# Altium footprint library PcbLib1.PcbLib: 31 footprints (part 1 of 2)
Each footprint in its own frame and in the unit in brackets; x right, y up, seen from the top. Pads: shape width x height; smd on the part's side, far side on the other; paste and mask are expansions set on the pad; w line width, h text height; cw(c..) or ccw(c..) is an arc to the next point about the centre after c.
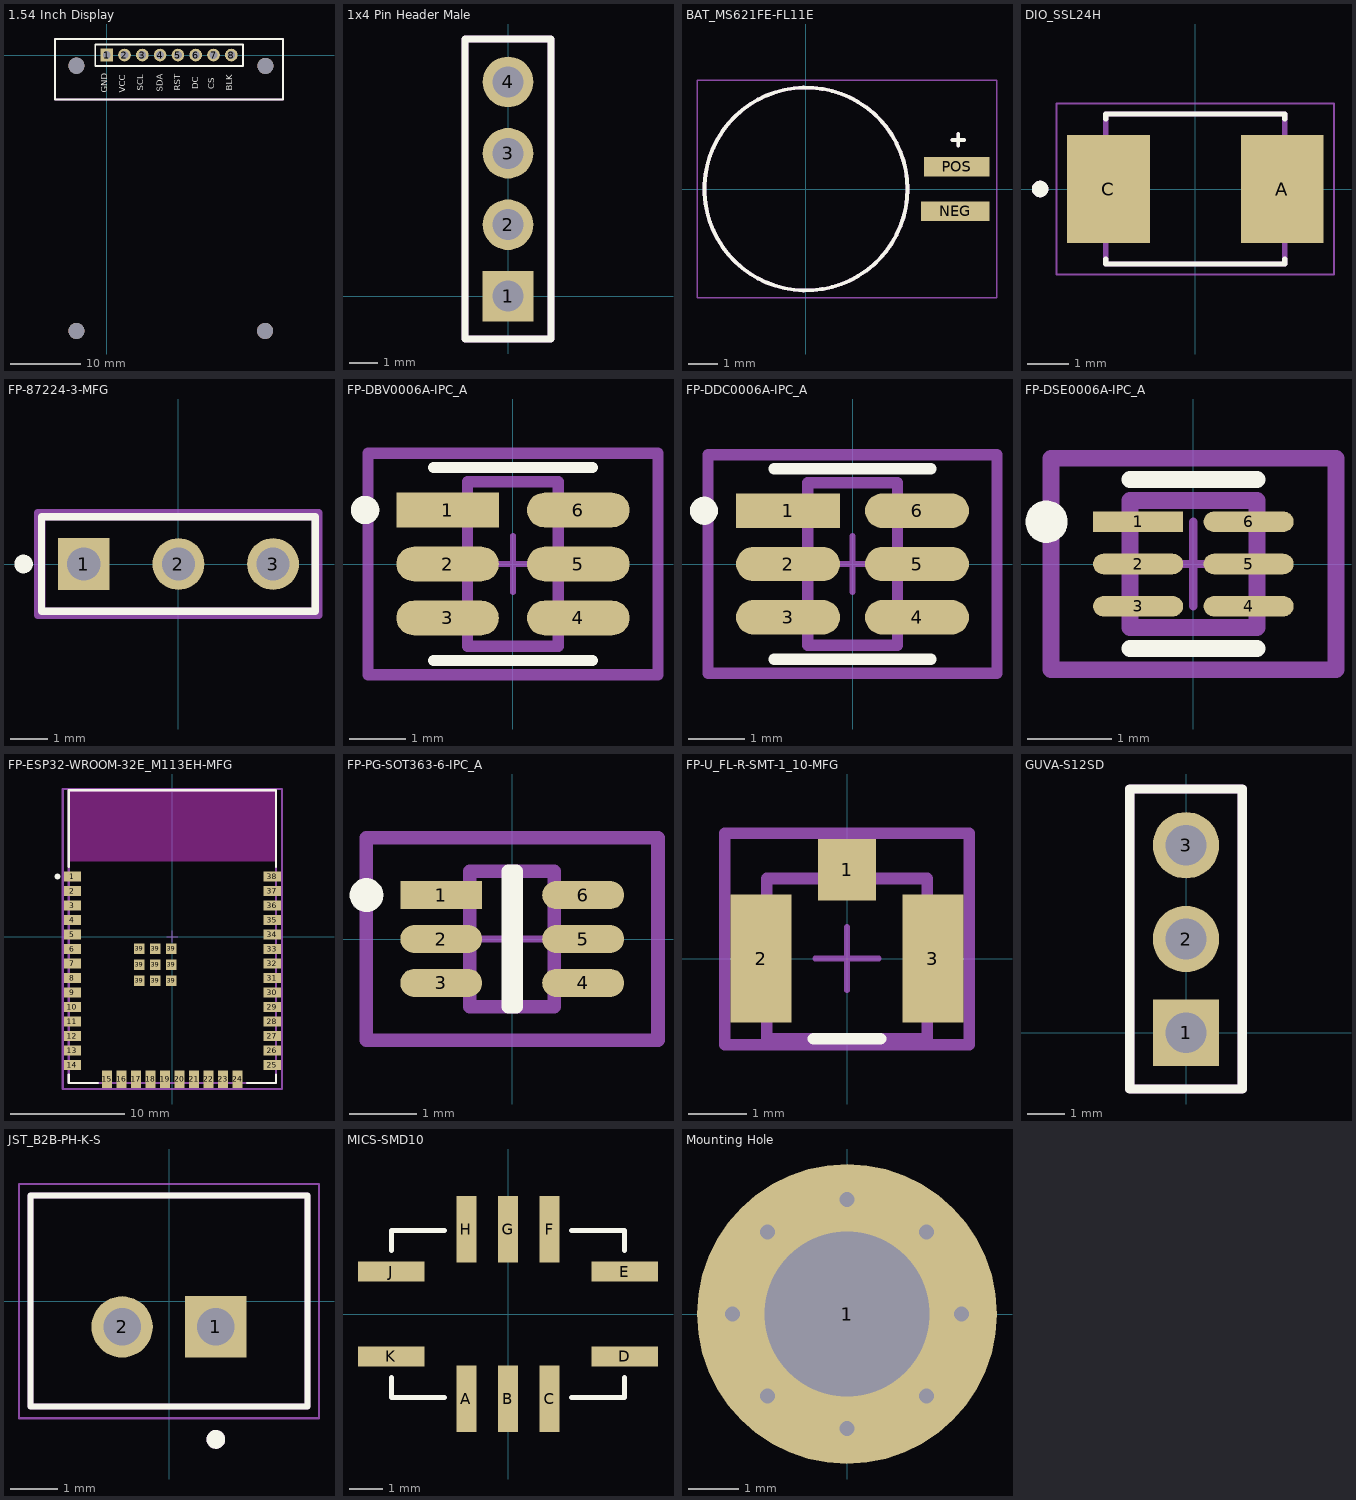
[diagram p0: the footprints below, top view; thin cyan lines are the x and y axes]

## 1.54 Inch Display [mm]
pads (12):
  rect 1.8x1.8 hole 1.1: 1(0,0)
  round 1.8 hole 1.1: 2(2.54,0) 3(5.08,0) 4(7.62,0) 5(10.16,0) 6(12.7,0) 7(15.24,0) 8(17.78,0)
  round 2.3 hole 2.3 unplated: ""(-4.318,-39.37) ""(-4.318,-1.524) ""(22.606,-39.37) ""(22.638,-1.547)
Top Overlay:
  lines w0.254: -7.366,-6.35 -7.366,2.286 25.146,2.286 25.146,-6.35 -7.366,-6.35 ; -1.626,-1.549 -1.626,1.499 19.456,1.499 19.456,-1.549 -1.626,-1.549
  text "BLK" at 18.186,-5.105 h1.5
  text "CS" at 15.628,-4.851 h1.5
  text "DC" at 13.344,-4.851 h1.5
  text "RST" at 10.802,-5.105 h1.5
  text "SDA" at 8.262,-5.232 h1.5
  text "SCL" at 5.468,-5.105 h1.5
  text "VCC" at 2.93,-5.359 h1.5
  text "GND" at 0.388,-5.359 h1.5
Mechanical 13:
  lines w0.254: -7.366,-6.35 -7.366,2.286 25.146,2.286 25.146,-6.35 -7.366,-6.35
3D body "1x8.STEP": height 22.8, standoff 11.46, extent -1.27,-1.3 19.05,1.24
3D body "ER-TFTM1.54-1_3D.stp": height 22.69, standoff 18.8, extent -7.216,-42.257 25.016,1.457
3D body "Standoff mf - M2.5 x 20 across flats 5mm.step": height 20, standoff -6, extent -6.818,-42.257 -1.818,-36.483
3D body "Standoff mf - M2.5 x 20 across flats 5mm.step": height 20, standoff -6, extent 20.138,-4.434 25.138,1.34
3D body "Standoff mf - M2.5 x 20 across flats 5mm.step": height 20, standoff -6, extent -6.818,-4.411 -1.818,1.363
3D body "Standoff mf - M2.5 x 20 across flats 5mm.step": height 20, standoff -6, extent 20.138,-42.257 25.138,-36.483

## 1x4 Pin Header Male [mm]
pads (4):
  rect 1.8x1.8 hole 1.1: 1(0,0)
  round 1.8 hole 1.1: 2(0,2.54) 3(0,5.08) 4(0,7.62)
Top Overlay:
  lines w0.254: -1.524,-1.524 1.524,-1.524 1.524,9.144 -1.524,9.144 -1.524,-1.524
Mechanical 13:
  lines w0.254: -1.524,-1.524 -1.524,9.144 1.524,9.144 1.524,-1.524 -1.524,-1.524

## 1000 mAh battery [mm]
3D body "1100mAh lipo v8.step": height 10, standoff 2, extent -23.2,-14 23,14

## BAT_MS621FE-FL11E [mm]
pads (2):
  rect 2.3x0.65 smd: NEG(5,-0.75)
  rect 2.2x0.65 smd: POS(5.05,0.75)
Top Overlay:
  circle w0.127: c0,0 r3.4
  lines w0.127: 4.9,1.646 5.3,1.646 ; 5.1,1.446 5.1,1.846
Mechanical 13:
  circle w0.127: c0,0 r3.4
  lines w0.127: 4.9,1.646 5.3,1.646 ; 5.1,1.446 5.1,1.846
Mechanical 15:
  lines w0.05: -3.65,-3.65 6.4,-3.65 6.4,3.65 -3.65,3.65 -3.65,-3.65
3D body "step_temp.STEP": height 2.8, standoff 0, extent -3.391,-3.4 5.9,3.4

## DIO_SSL24H [mm]
pads (2):
  rect 2x2.6 smd: A(2.1,0) C(-2.1,0)
Top Overlay:
  circle w0.2: c-3.75,0 r0.1
  lines w0.127: -2.163,-1.7 -2.163,-1.813 2.163,-1.813 2.163,-1.7 ; -2.163,1.7 -2.163,1.813 2.163,1.813 2.163,1.7
Mechanical 13:
  circle w0.2: c-3.75,0 r0.1
  lines w0.127: -2.163,-1.813 2.163,-1.813 2.163,1.813 -2.163,1.813 -2.163,-1.813
Mechanical 15:
  lines w0.05: -3.35,-2.063 3.35,-2.063 3.35,2.063 -3.35,2.063 -3.35,-2.063
3D body "step_temp.STEP": height 2.65, standoff 0, extent -2.675,-1.813 2.675,1.813

## FP-87224-3-MFG [mil]
pads (3):
  rect 54.69x54.69 hole 35 paste-99999 mask+0: 1(-100,0)
  round 54.69 hole 35 paste-99999 mask+0: 2(0,0) 3(100,0)
Top Overlay:
  circle w9.84: c-163.39,0 r4.92
  lines w7.87: -144.55,-50.05 144.55,-50.05 144.55,50.05 -144.55,50.05 -144.55,-50.05
Top 3D Body:
  lines w7.87: -144.5,-50 144.5,-50 144.5,50 -144.5,50 -144.5,-50
Top Courtyard:
  lines w7.87: -148.44,-53.94 148.44,-53.94 148.44,53.94 -148.44,53.94 -148.44,-53.94
Top Assembly:
  lines w7.87: -148.44,-53.94 148.44,-53.94 148.44,53.94 -148.44,53.94 -148.44,-53.94
  text ".Designator" at 0,-0.02 h39.37
Top Component Center:
  lines w3.94: -19.68,0 19.68,0 ; 0,-19.68 0,19.68
3D body "Conn_TE_Connectivity_87224-3_eec.STEP": height 10, standoff 0, extent -148.44,-53.94 148.44,53.94
3D body "Pin header jumper.stp": height 338.58, standoff 102.36, extent -49.43,-47 147.43,51.43

## FP-DBV0006A-IPC_A [mm]
pads (6):
  rect 1.805x0.61 smd paste+0 mask+0: 1(-1.15,0.95)
  rrect100% 1.805x0.61 smd paste+0 mask+0: 2(-1.15,0) 3(-1.15,-0.95) 4(1.15,-0.95) 5(1.15,0) 6(1.15,0.95)
Top Overlay:
  circle w0.25: c-2.603,0.95 r0.125
  lines w0.2: -1.4,-1.7 1.4,-1.7 ; -1.4,1.7 1.4,1.7
Top 3D Body:
  lines w0.2: -0.8,-1.45 0.8,-1.45 0.8,1.45 -0.8,1.45 -0.8,-1.45
Top Courtyard:
  lines w0.2: -2.553,-1.95 2.553,-1.95 2.553,1.95 -2.553,1.95 -2.553,-1.95
Top Assembly:
  lines w0.2: -2.553,-1.95 2.553,-1.95 2.553,1.95 -2.553,1.95 -2.553,-1.95
  text ".Designator" at 0,0.188 h1
Top Component Center:
  lines w0.1: -0.5,0 0.5,0 ; 0,-0.5 0,0.5
3D body "IC_Texas_Instruments_LM74700QDBVRQ1_eec.STEP": height 0.25, standoff 0, extent -2.553,-1.95 2.553,1.95

## FP-DDC0006A-IPC_A [mm]
pads (6):
  rect 1.854x0.612 smd paste+0 mask+0: 1(-1.15,0.95)
  rrect100% 1.854x0.612 smd paste+0 mask+0: 2(-1.15,0) 3(-1.15,-0.95) 4(1.15,-0.95) 5(1.15,0) 6(1.15,0.95)
Top Overlay:
  circle w0.25: c-2.65,0.95 r0.125
  lines w0.2: -1.4,-1.7 1.4,-1.7 ; -1.4,1.7 1.4,1.7
Top 3D Body:
  lines w0.2: -0.8,-1.45 0.8,-1.45 0.8,1.45 -0.8,1.45 -0.8,-1.45
Top Courtyard:
  lines w0.2: -2.577,-1.95 2.577,-1.95 2.577,1.95 -2.577,1.95 -2.577,-1.95
Top Assembly:
  lines w0.2: -2.577,-1.95 2.577,-1.95 2.577,1.95 -2.577,1.95 -2.577,-1.95
  text ".Designator" at 0,0.188 h1
Top Component Center:
  lines w0.1: -0.5,0 0.5,0 ; 0,-0.5 0,0.5
3D body "IC_Texas_Instruments_TPS562201DDCT_eec.STEP": height 0.25, standoff 0, extent -2.577,-1.95 2.577,1.95

## FP-DSE0006A-IPC_A [mm]
pads (6):
  rect 1.065x0.242 smd paste+0 mask+0: 1(-0.654,0.5)
  rrect100% 1.065x0.242 smd paste+0 mask+0: 2(-0.654,0) 3(-0.654,-0.5) 4(0.654,-0.5) 5(0.654,0) 6(0.654,0.5)
Top Overlay:
  circle w0.25: c-1.736,0.5 r0.125
  lines w0.2: -0.75,-1 0.75,-1 ; -0.75,1 0.75,1
Top 3D Body:
  lines w0.2: -0.75,-0.75 -0.75,0.75 0.75,0.75 0.75,-0.75 -0.75,-0.75
Top Courtyard:
  lines w0.2: -1.686,-1.25 -1.686,1.25 1.686,1.25 1.686,-1.25 -1.686,-1.25
Top Assembly:
  lines w0.2: -1.686,-1.25 -1.686,1.25 1.686,1.25 1.686,-1.25 -1.686,-1.25
  text ".Designator" at 0,0.188 h1
Top Component Center:
  lines w0.1: -0.5,0 0.5,0 ; 0,-0.5 0,0.5
3D body "IC_Texas_Instruments_BQ29700DSET_eec.STEP": height 0.25, standoff 0, extent -1.686,-1.25 1.686,1.25

## FP-ESP32-WROOM-32E_M113EH-MFG [mm]
pads (47):
  rect 1.5x0.9 smd paste+0 mask+0: 1(-8.75,5.26) 2(-8.75,3.99) 3(-8.75,2.72) 4(-8.75,1.45) 5(-8.75,0.18) 6(-8.75,-1.09) 7(-8.75,-2.36) 8(-8.75,-3.63) 9(-8.75,-4.9) 10(-8.75,-6.17) 11(-8.75,-7.44) 12(-8.75,-8.71) 13(-8.75,-9.98) 14(-8.75,-11.25) 25(8.75,-11.25) 26(8.75,-9.98) 27(8.75,-8.71) 28(8.75,-7.44) 29(8.75,-6.17) 30(8.75,-4.9) 31(8.75,-3.63) 32(8.75,-2.36) 33(8.75,-1.09) 34(8.75,0.18) 35(8.75,1.45) 36(8.75,2.72) 37(8.75,3.99) 38(8.75,5.26)
  rect 0.9x1.5 smd paste+0 mask+0: 15(-5.715,-12.5) 16(-4.445,-12.5) 17(-3.175,-12.5) 18(-1.905,-12.5) 19(-0.635,-12.5) 20(0.635,-12.5) 21(1.905,-12.5) 22(3.175,-12.5) 23(4.445,-12.5) 24(5.715,-12.5)
  rect 0.9x0.9 smd paste+0 mask+0: 39(-2.9,-3.86) 39(-2.9,-2.46) 39(-2.9,-1.06) 39(-1.5,-3.86) 39(-1.5,-2.46) 39(-1.5,-1.06) 39(-0.1,-3.86) 39(-0.1,-2.46) 39(-0.1,-1.06)
Top Overlay:
  circle w0.25: c-10.05,5.26 r0.125
  lines w0.2: -9.075,-12.075 -9.075,-12.825 -6.54,-12.825 ; -9.075,6.085 -9.075,12.825 9.075,12.825 9.075,6.085 ; 6.54,-12.825 9.075,-12.825 9.075,-12.075
Keep-Out Layer:
  rectangle: -9,6.56 9,12.75
Top 3D Body:
  lines w0.2: -9.075,-12.825 -9.075,12.825 9.075,12.825 9.075,-12.825 -9.075,-12.825
Top Courtyard:
  lines w0.2: -9.6,-13.35 -9.6,12.925 9.6,12.925 9.6,-13.35 -9.6,-13.35
Top Assembly:
  lines w0.2: -9.6,-13.35 -9.6,12.925 9.6,12.925 9.6,-13.35 -9.6,-13.35
  text ".Designator" at 0,-0.025 h1
Top Component Center:
  lines w0.1: -0.5,0 0.5,0 ; 0,-0.5 0,0.5
3D body "UNK_Espressif_Systems_ESP32-WROOM-32E_M113EH3200PH3Q0_eec.STEP": height 0.25, standoff 0, extent -9.6,-13.35 9.6,12.925

## FP-PG-SOT363-6-IPC_A [mm]
pads (6):
  rect 1.212x0.416 smd paste+0 mask+0: 1(-1.05,0.65)
  rrect100% 1.212x0.416 smd paste+0 mask+0: 2(-1.05,0) 3(-1.05,-0.65) 4(1.05,-0.65) 5(1.05,0) 6(1.05,0.65)
Top Overlay:
  circle w0.25: c-2.156,0.65 r0.125
  lines w0.2: -0.056,-1 0.056,-1 0.056,1 -0.056,1 -0.056,-1
Top 3D Body:
  lines w0.2: -0.625,-1 -0.625,1 0.625,1 0.625,-1 -0.625,-1
Top Courtyard:
  lines w0.2: -2.156,-1.5 -2.156,1.5 2.156,1.5 2.156,-1.5 -2.156,-1.5
Top Assembly:
  lines w0.2: -2.156,-1.5 -2.156,1.5 2.156,1.5 2.156,-1.5 -2.156,-1.5
  text ".Designator" at 0,0.188 h1
Top Component Center:
  lines w0.1: -0.5,0 0.5,0 ; 0,-0.5 0,0.5
3D body "Trans_Infineon_BC847SH6433XTMA1_eec.STEP": height 0.25, standoff 0, extent -1.5,-2.156 1.5,2.156

## FP-U_FL-R-SMT-1_10-MFG [mm]
pads (3):
  rect 1x1.05 smd paste-1000 mask+0: 1(0,1.525)
  rect 1.05x2.2 smd paste-1000 mask+0: 2(-1.475,0) 3(1.475,0)
Top Overlay:
  lines w0.2: -0.575,-1.375 0.575,-1.375
Top Paste:
  rectangle: -1.95,-1 -1.05,1
  rectangle: 1.05,-1 1.95,1
  rectangle: -0.4,1.1 0.4,1.95
Top 3D Body:
  lines w0.2: -1.375,-1.375 1.375,-1.375 1.375,1.375 -1.375,1.375 -1.375,-1.375
Top Courtyard:
  lines w0.2: -2.1,-1.475 2.1,-1.475 2.1,2.15 -2.1,2.15 -2.1,-1.475
Top Assembly:
  lines w0.2: -2.1,-1.475 2.1,-1.475 2.1,2.15 -2.1,2.15 -2.1,-1.475
  text ".Designator" at 0,0.525 h1
Top Component Center:
  lines w0.1: -0.544,0 0.544,0 ; 0,-0.544 0,0.544
3D body "Conn_HIROSE_U_FL-R-SMT-1_10_eec.STEP": height 0.25, standoff 0, extent -2.1,-1.475 2.1,2.15

## GUVA-S12SD [mm] "SENSOR PHOTODIODE 2SMD"
pads (3):
  rect 1.8x1.8 hole 1.1: 1(0,0)
  round 1.8 hole 1.1: 2(0,2.54) 3(0,5.08)
Top Overlay:
  lines w0.254: -1.524,-1.524 1.524,-1.524 1.524,6.604 -1.524,6.604 -1.524,-1.524
Mechanical 13:
  lines w0.254: -1.524,-1.524 1.524,-1.524 1.524,6.604 -1.524,6.604 -1.524,-1.524
3D body "GUVA-S12SD revised.step": height 29, standoff -2.89, extent -0.353,-2.96 7.7,8.04

## JST_B2B-PH-K-S [mm]
pads (2):
  rect 1.308x1.308 hole 0.8: 1(1,-0.55)
  round 1.308 hole 0.8: 2(-1,-0.55)
Top Overlay:
  circle w0.2: c1,-2.95 r0.1
  lines w0.127: -2.95,-2.25 2.95,-2.25 2.95,2.25 -2.95,2.25 -2.95,-2.25
Mechanical 13:
  circle w0.2: c1,-2.95 r0.1
  lines w0.127: -2.95,-2.25 -2.95,2.25 2.95,2.25 2.95,-2.25 -2.95,-2.25
Mechanical 15:
  lines w0.05: -3.2,-2.5 -3.2,2.5 3.2,2.5 3.2,-2.5 -3.2,-2.5
3D body "step_temp.STEP": height 6, standoff -3.4, extent -2.95,-2.25 2.95,2.25

## MICS-SMD10 [mm]
pads (10):
  rect 0.6x2 smd: A(-1.25,-2.54) B(0,-2.54) C(1.25,-2.54) F(1.25,2.54) G(0,2.54) H(-1.25,2.54)
  rect 2x0.6 smd: D(3.5,-1.27) E(3.5,1.27) J(-3.5,1.27) K(-3.5,-1.27)
Top Overlay:
  lines w0.152: -3.5,-1.9 -3.5,-2.5 -1.9,-2.5 ; -3.5,1.9 -3.5,2.5 -1.9,2.5 ; 1.9,-2.5 3.5,-2.5 3.5,-1.9 ; 1.9,2.5 3.5,2.5 3.5,1.9

## Mounting Hole [mm]
pads (1):
  round 6 hole 3.3: 1(0,0)
via 0,2.286 diameter 0.6 hole 0.3
via 0,-2.286 diameter 0.6 hole 0.3
via -2.286,0 diameter 0.6 hole 0.3
via 2.286,0 diameter 0.6 hole 0.3
via -1.588,1.636 diameter 0.6 hole 0.3
via 1.588,-1.636 diameter 0.6 hole 0.3
via -1.588,-1.636 diameter 0.6 hole 0.3
via 1.588,1.636 diameter 0.6 hole 0.3